# Altium integrated library 刘兴达Lib.IntLib: 614 symbols (part 1 of 4) (continued)
## BQ24640 (continued)
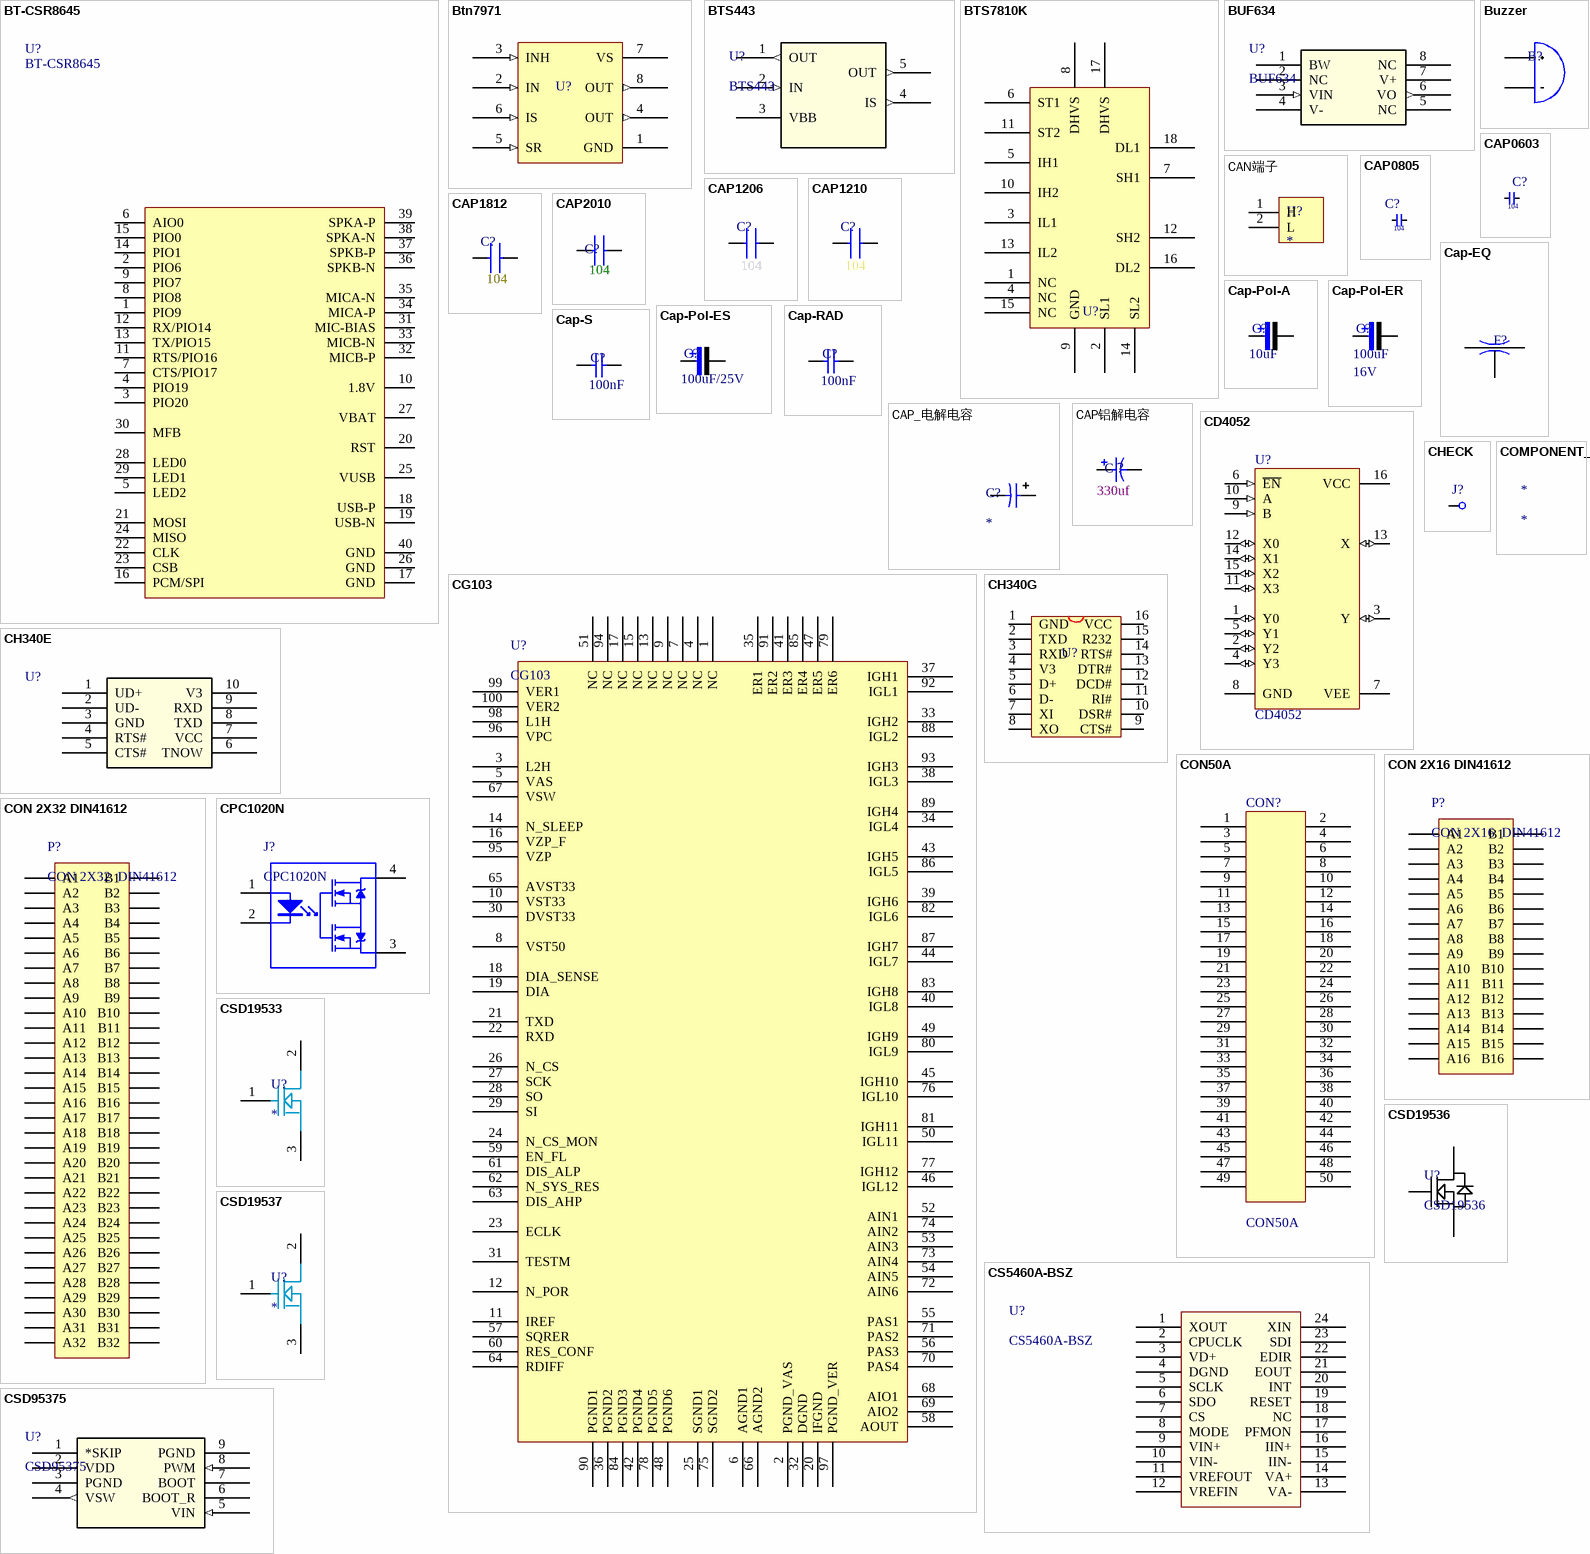
[diagram p3: symbols BT-CSR8645 to CSD95375]

## BT-CSR8645
designator U?
蓝牙模块
footprint HDR-BT86XX
pins: 1 PIO9, 2 PIO6, 3 PIO20, 4 PIO19, 5 LED2, 6 AIO0, 7 CTS/PIO17, 8 PIO8, 9 PIO7, 10 1.8V, 11 RTS/PIO16, 12 RX/PIO14, 13 TX/PIO15, 14 PIO1, 15 PIO0, 16 PCM/SPI, 17 GND, 18 USB-P, 19 USB-N, 20 RST, 21 MOSI, 22 CLK, 23 CSB, 24 MISO, 25 VUSB, 26 GND, 27 VBAT, 28 LED0, 29 LED1, 30 MFB, 31 MIC-BIAS, 32 MICB-P, 33 MICB-N, 34 MICA-P, 35 MICA-N, 36 SPKB-N, 37 SPKB-P, 38 SPKA-N, 39 SPKA-P, 40 GND

## Btn7971
designator U?  (value not drawn)
半桥驱动
footprint Btn7971
pins: 1 GND (power), 2 IN (in), 3 INH (in), 4 OUT (out), 5 SR (in), 6 IS (in), 7 VS (power), 8 OUT (out)

## BTS443
designator U?
MOS高端开关; Manufacturer_Part_Number: BTS443P; Vendor: Infineon; Built_By: EMA_UL_Team; Copyright: Copyright (C) 2018 Accelerated Designs. All rights reserved; RefDes: RefDes; Type: DEV; Value: Value
footprint TO-252-5
pins: 1 OUT (out), 2 IN (in), 3 VBB (power), 4 IS (out), 5 OUT (out)

## BTS7810K
designator U?  (value not drawn)
全桥驱动
footprint BTS7810K
pins: 1 NC, 2 SL1, 3 IL1, 4 NC, 5 IH1, 6 ST1, 7 SH1, 8 DHVS, 9 GND, 10 IH2, 11 ST2, 12 SH2, 13 IL2, 14 SL2, 15 NC, 16 DL2, 17 DHVS, 18 DL1

## BUF634
designator U?
高输出跟随器; Manufacturer: Texas Instruments; Manufacturer_Part_Number: buf634_d_8; INDUSTRY_STD_PKG_TYPE: SOIC; FAMILY_NAME: FIXED GAIN; PIN_COUNT: 8; PACKAGE_DESIGNATOR: D; Datasheet_URL: http://www.ti.com/lit/gpn/BUF634; GENERIC_PART_NUMBER: BUF634; Vendor: Texas Instruments; Value: Value; Type: Type; RefDes: RefDes
footprint SOIC-8 (3mm)
pins: 1 BW, 2 NC, 3 VIN (in), 4 V- (power), 5 NC, 6 VO (out), 7 V+ (power), 8 NC

## Buzzer
designator B?  (value not drawn)
蜂鸣器
footprint Bell_7.62
footprint Buzzer-8530
pins: 1 A, 2 B

## CAN端子
designator H?
footprint CAN端子
pins: 1 H, 2 L

## CAP0603
designator C?  (value not drawn)
footprint CAP0603
pins: 1, 2
text: 104

## CAP0805
designator C?, comment 104
footprint CAP
pins: 1, 2

## CAP1206
designator C?  (value not drawn)
footprint CAP1206
pins: 1, 2
text: 104

## CAP1210
designator C?  (value not drawn)
footprint CAP1210
pins: 1, 2
text: 104

## CAP1812
designator C?  (value not drawn)
footprint CAP1812
pins: 1, 2
text: 104

## CAP2010
designator C?  (value not drawn)
footprint CAP2010
pins: 1, 2
text: 104

## Cap-EQ
designator F?  (value not drawn)
馈通式电容; Published: 8-Jun-2000; LatestRevisionDate: 17-Jul-2002; LatestRevisionNote: Re-released for DXP Platform.; PackageReference: RAD-0.3; Publisher: Altium Limited
footprint 0805-EQ (0805带丝印)
pins: 1 IN, 2 GND, 3 OUT

## Cap-Pol-A
designator C?, comment value 10uF  (hidden comment: Cap-Pol)
钽电容; Published: 8-Jun-2000; LatestRevisionDate: 17-Jul-2002; LatestRevisionNote: Re-released for DXP Platform.; PackageReference: RB7.6-15; Publisher: Altium Limited
footprint CAP-7343 (钽电容)
footprint CAP-3528 (钽电容)
footprint CAP-3216 (钽电容)
footprint CAP-6032 (钽电容)
pins: 1, 2
1 alternate drawing of the same symbol

## Cap-Pol-ER
designator C?  value 100uF  Vol: 16V  (hidden comment: Cap-Pol-ER)
插件电解电容; Published: 8-Jun-2000; LatestRevisionDate: 17-Jul-2002; LatestRevisionNote: Re-released for DXP Platform.; PackageReference: RB7.6-15; Publisher: Altium Limited
footprint C-RB-5.0/10 (插件电解电容)
footprint C-RB-7.5/18 (插件电解电容)
footprint C-RB-3.5/8 (插件电解电容)
footprint C-RB-5.0/13 (插件电解电容)
pins: 1, 2
1 alternate drawing of the same symbol

## Cap-Pol-ES
designator C?  value 100uF/25V  (hidden comment: Cap-Pol-ES)
贴片铝电解电容; Published: 8-Jun-2000; LatestRevisionDate: 17-Jul-2002; LatestRevisionNote: Re-released for DXP Platform.; PackageReference: RB7.6-15; Publisher: Altium Limited
footprint C-RB-SD6 (贴片铝电解)
footprint C-RB-SD8 (贴片铝电解)
footprint C-RB-SD10 (贴片铝电解)
pins: 1, 2
1 alternate drawing of the same symbol

## Cap-RAD
designator C?, comment value 100nF  (hidden comment: Cap)
插件瓷片电容; Published: 8-Jun-2000; LatestRevisionDate: 17-Jul-2002; LatestRevisionNote: Re-released for DXP Platform.; PackageReference: RAD-0.3; Publisher: Altium Limited
footprint C-RAD (瓷片电容)
pins: 1, 2

## Cap-S
designator C?  value 100nF  (hidden comment: Cap-S)
贴片瓷片电容; Published: 8-Jun-2000; LatestRevisionDate: 17-Jul-2002; LatestRevisionNote: Re-released for DXP Platform.; PackageReference: RAD-0.3; Publisher: Altium Limited
footprint C-0805 (贴片电容)
footprint C-0603 (贴片电容)
footprint 0603-2 (贴片无丝印)
footprint 0805-2 (贴片无丝印)
footprint C-1210 (贴片电容)
footprint 1812 (贴片元件)
footprint 0402 (Chip Capacitor, Body 1.0x0.5mm, IPC High Density)
pins: 1, 2

## CAP_电解电容
designator C?
footprint C_CAP_10*8.3
pins: 1, 2

## CAP铝解电容
designator C？  (value not drawn)
footprint CAP铝解电容
pins: 1, 2
text: 330uf

## CD4052
designator U?
双通道模拟开关; Published: 17-Jul-2002; LatestRevisionDate: 13-Apr-2006; LatestRevisionNote: IPC-7351 Footprint Added.; DatasheetVersion: Jan-1999; PackageVersion: 2000; PackageReference: M16A; Publisher: Altium Limited; PackageDescription: 16-Pin Small Outline Integrated Circuit 1.27 mm Pitch; Code_IPC: SOIC127P600-16; ComponentLink1Description: Manufacturer Link; ComponentLink1URL: http://www.fairchildsemi.com/; ComponentLink2Description: Datasheet; ComponentLink2URL: http://www.fairchildsemi.com/ds/CD%2FCD4052BC.pdf
footprint SOIC-16
pins: 1 Y0 (io), 2 Y2 (io), 3 Y (io), 4 Y3 (io), 5 Y1 (io), 6 ~{EN} (in), 7 VEE (power), 8 GND (power), 9 B (in), 10 A (in), 11 X3 (io), 12 X0 (io), 13 X (io), 14 X1 (io), 15 X2 (io), 16 VCC (power)

## CG103
designator U?
BOSCH点火芯片
footprint LQFP-100 (LQFP)
pins: 1 NC, 2 PGND_VAS, 3 L2H, 4 NC, 5 VAS, 6 AGND1, 7 NC, 8 VST50, 9 NC, 10 VST33, 11 IREF, 12 N_POR, 13 NC, 14 N_SLEEP, 15 NC, 16 VZP_F, 17 NC, 18 DIA_SENSE, 19 DIA, 20 IFGND, 21 TXD, 22 RXD, 23 ECLK, 24 N_CS_MON, 25 SGND1, 26 N_CS, 27 SCK, 28 SO, 29 SI, 30 DVST33, 31 TESTM, 32 DGND, 33 IGH2, 34 IGL4, 35 ER1, 36 PGND2, 37 IGH1, 38 IGL3, 39 IGH6, 40 IGL8, 41 ER3, 42 PGND4, 43 IGH5, 44 IGL7, 45 IGH10, 46 IGL12, 47 ER5, 48 PGND6, 49 IGH9, 50 IGL11, 51 NC, 52 AIN1, 53 AIN3, 54 AIN5, 55 PAS1, 56 PAS3, 57 SQRER, 58 AOUT, 59 EN_FL, 60 RES_CONF, 61 DIS_ALP, 62 N_SYS_RES, 63 DIS_AHP, 64 RDIFF, 65 AVST33, 66 AGND2, 67 VSW, 68 AIO1, 69 AIO2, 70 PAS4, 71 PAS2, 72 AIN6, 73 AIN4, 74 AIN2, 75 SGND2, 76 IGL10, 77 IGH12, 78 PGND5, 79 ER6, 80 IGL9, 81 IGH11, 82 IGL6, 83 IGH8, 84 PGND3, 85 ER4, 86 IGL5, 87 IGH7, 88 IGL2, 89 IGH4, 90 PGND1, 91 ER2, 92 IGL1, 93 IGH3, 94 NC, 95 VZP, 96 VPC, 97 PGND_VER, 98 L1H, 99 VER1, 100 VER2

## CH340E
designator U?
USB转串口; Manufacturer: Texas Instruments; Manufacturer_Part_Number: SN74LVC1G14DBVR; Built_By: EMA_UL_Team; Vendor: Texas Instruments; Copyright: Copyright (C) 2018 Accelerated Designs. All rights reserved; RefDes: RefDes; Type: DEV; Value: Value
footprint MSOP-10
pins: 1 UD+, 2 UD-, 3 GND (power), 4 RTS#, 5 CTS# (power), 6 TNOW, 7 VCC, 8 TXD, 9 RXD, 10 V3

## CH340G
designator U?  (value not drawn)
usb转串口
footprint SOIC-16
pins: 1 GND, 2 TXD, 3 RXD, 4 V3, 5 D+, 6 D-, 7 XI, 8 XO, 9 CTS#, 10 DSR#, 11 RI#, 12 DCD#, 13 DTR#, 14 RTS#, 15 R232, 16 VCC

## CHECK
designator J?  (value not drawn)
测试点
footprint CHECK-A (Connector; Plug)
footprint CHECK-B (Connector; Plug)
pins: 1

## COMPONENT_1
designator *

## CON50A
designator CON?
Remark: 0.5mm 50P B2B 3.5mm合高 母头
footprint B2B_0D50_50P_MALE
pins: 1, 2, 3, 4, 5, 6, 7, 8, 9, 10, 11, 12, 13, 14, 15, 16, 17, 18, 19, 20, 21, 22, 23, 24, 25, 26, 27, 28, 29, 30, 31, 32, 33, 34, 35, 36, 37, 38, 39, 40, 41, 42, 43, 44, 45, 46, 47, 48, 49, 50
2 alternate drawings of the same symbol

## CON 2X16 DIN41612
designator P?, comment CON 2X16  DIN41612
DIN 41612
footprint EURO2.54-2H32D (Connector; DIN 41612, Type 2B, Thru-Hole; Rows a+b, 32 Position; Right Angle)
footprint EURO2.54-2V32B (Connector; DIN 41612, Type 2B, Thru-Hole; Rows a+b, 32 Position; Vertical)
pins: A1, A2, A3, A4, A5, A6, A7, A8, A9, A10, A11, A12, A13, A14, A15, A16, B1, B2, B3, B4, B5, B6, B7, B8, B9, B10, B11, B12, B13, B14, B15, B16

## CON 2X32 DIN41612
designator P?, comment CON 2X32  DIN41612
DIN 41612
footprint EURO2.54-2H64A (Connector; DIN 41612, Type B, Thru-Hole; Rows a+b, 64 Position; Right Angle)
footprint EURO2.54-2V64A (Connector; DIN 41612, Type B, Thru-Hole; Rows a+b, 64 Position; Vertical)
pins: A1, A2, A3, A4, A5, A6, A7, A8, A9, A10, A11, A12, A13, A14, A15, A16, A17, A18, A19, A20, A21, A22, A23, A24, A25, A26, A27, A28, A29, A30, A31, A32, B1, B2, B3, B4, B5, B6, B7, B8, B9, B10, B11, B12, B13, B14, B15, B16, B17, B18, B19, B20, B21, B22, B23, B24, B25, B26, B27, B28, B29, B30, B31, B32

## CPC1020N
designator J?
固态继电器
footprint SOP-4 (SOP, 4-Leads, Body 2.7x4.5mm (max), Pitch 1.27mm, IPC Medium Density)
pins: 1 A "Anode", 2 K "Cathode", 3, 4

## CS5460A-BSZ
designator U?
电能计量; Vendor: Cirrus Logic; Built_By: EMA_UL_Team; Manufacturer_Part_Number: CS5460A-BSZ; Copyright: Copyright (C) 2018 Accelerated Designs. All rights reserved; RefDes: RefDes; Type: DEV; Value: Value
footprint SSOP-24
pins: 1 XOUT, 2 CPUCLK, 3 VD+ (power), 4 DGND (power), 5 SCLK, 6 SDO, 7 CS, 8 MODE, 9 VIN+, 10 VIN-, 11 VREFOUT, 12 VREFIN, 13 VA- (power), 14 VA+ (power), 15 IIN-, 16 IIN+, 17 PFMON (power), 18 NC, 19 RESET, 20 INT, 21 EOUT, 22 EDIR, 23 SDI, 24 XIN

## CSD19533
designator U?
MOS; Manufacturer_Part_Number: CSD19537Q3; VdsMax: 100.0; IdsMax: 50.0; Rdson45: 0.025; QgTyp: 16.0; Vendor: Texas Instruments; Datasheet_URL: http://www.ti.com/lit/ds/symlink/csd19537q3.pdf; Quantity: 1; RefDes: RefDes; Type: TYPE; Value: Value
footprint VSONP-8
pins: 1 Gate, 2 Drain, 3 Source

## CSD19536
designator U?
MOS; Manufacturer_Part_Number: CSD19536KTT; Vendor: Texas Instruments; Built_By: Texas_Instrument_Team; Copyright: Copyright (C) 2018 Accelerated Designs. All rights reserved; RefDes: RefDes; Type: DEV; Value: Value
footprint TO-263-3
pins: 1 Gate, 2 Drain, 3 Source

## CSD19537
designator U?
MOS; Manufacturer_Part_Number: CSD19537Q3; VdsMax: 100.0; IdsMax: 50.0; Rdson45: 0.025; QgTyp: 16.0; Vendor: Texas Instruments; Datasheet_URL: http://www.ti.com/lit/ds/symlink/csd19537q3.pdf; Quantity: 1; RefDes: RefDes; Type: TYPE; Value: Value
footprint SON 3.3*3.3
pins: 1 Gate, 2 Drain, 3 Source

## CSD95375
designator U?
24V功率级; Manufacturer_Part_Number: CSD95375Q4M; Vendor: Texas Instruments; Built_By: EMA_UL_Team; Copyright: Copyright (C) 2018 Accelerated Designs. All rights reserved; RefDes: RefDes; Type: DEV; Value: Value
footprint VSON-8
pins: 1 *SKIP, 2 VDD (power), 3 PGND (power), 4 VSW (out), 5 VIN (in), 6 BOOT_R, 7 BOOT, 8 PWM (in), 9 PGND (power)

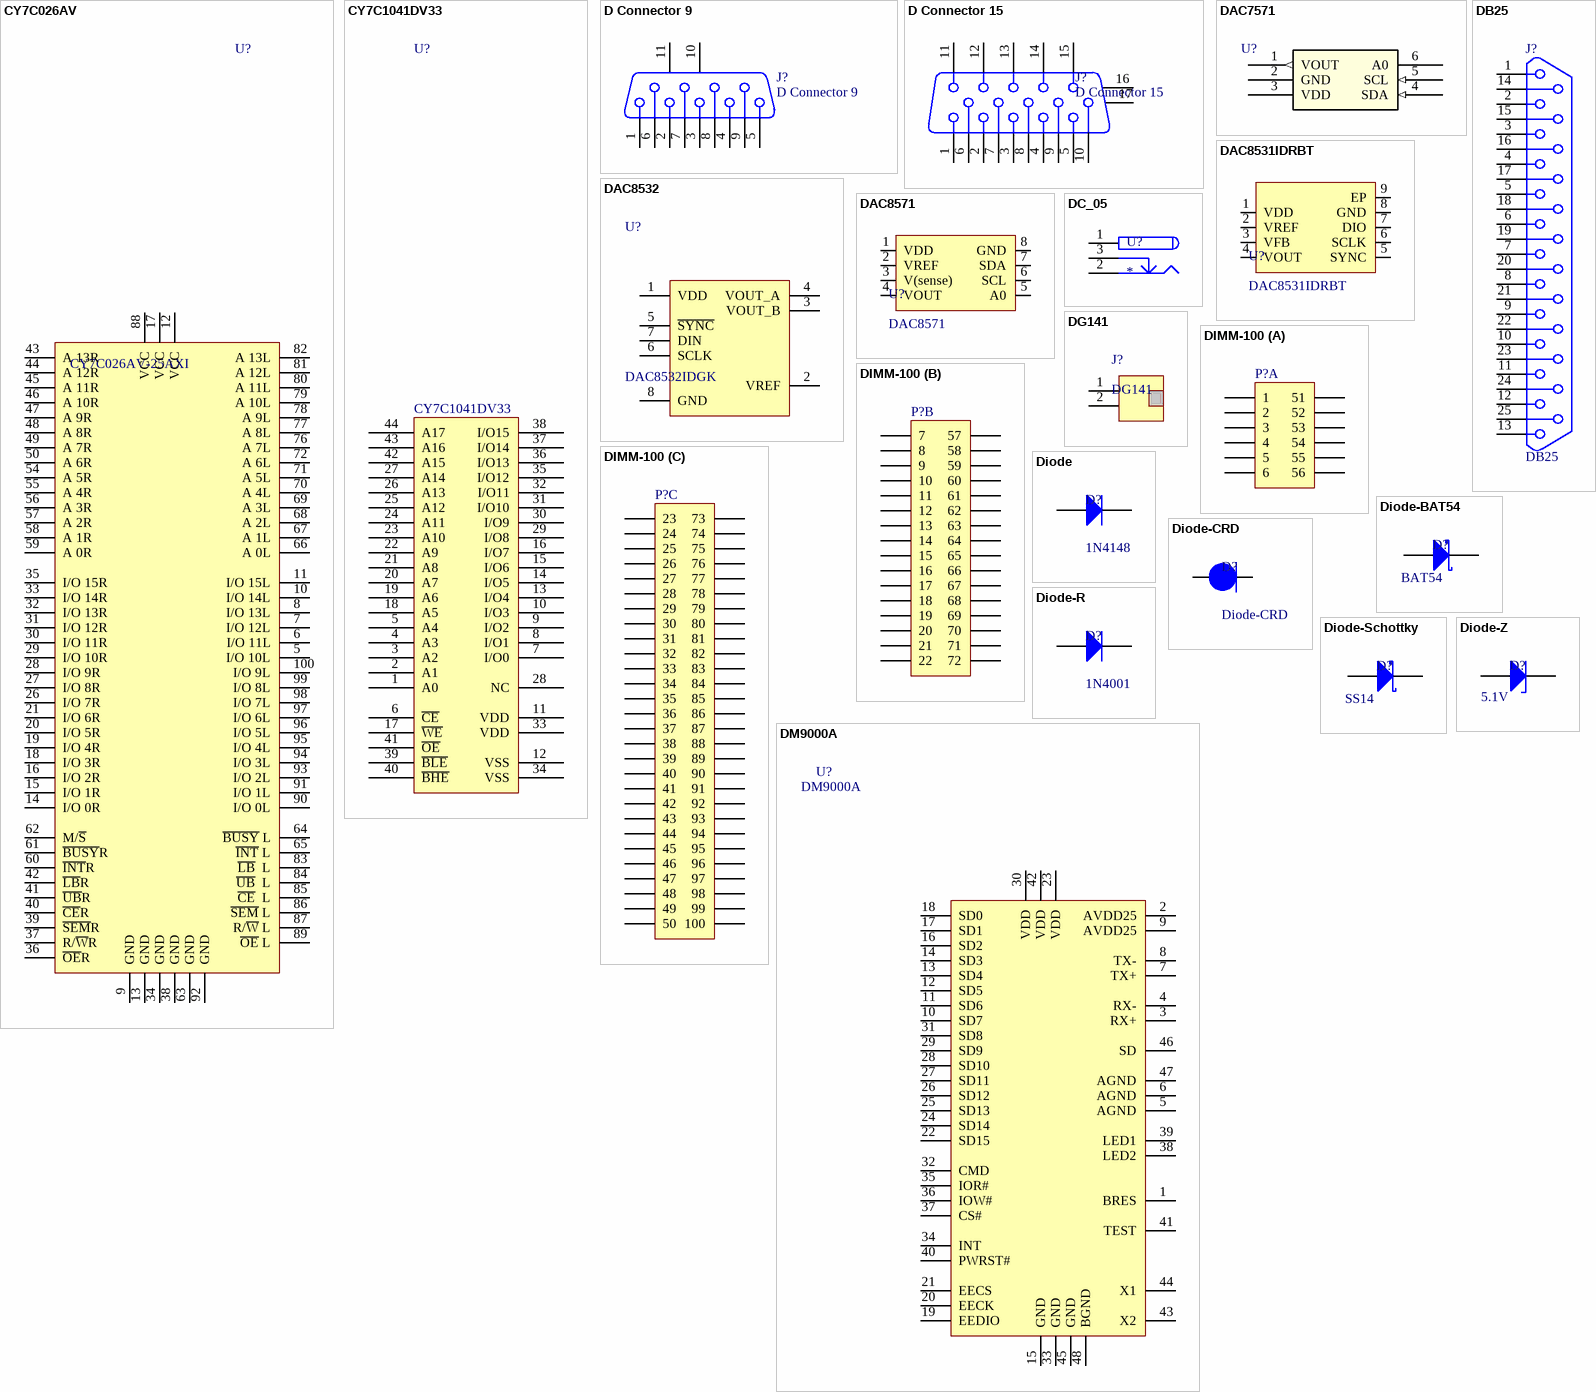
[diagram p4: symbols CY7C026AV to DM9000A]

## CY7C026AV
designator U?, comment CY7C026AV-25AXI
RAM
footprint TQFP-100 (Thin QFP, 100-Leads, Body 14x14mm, Pitch 0.5mm, IPC Low Density)
pins: 1 NC hidden, 2 NC hidden, 3 NC hidden, 4 NC hidden, 5 I/O 10L, 6 I/O 11L, 7 I/O 12L, 8 I/O 13L, 9 GND, 10 I/O 14L, 11 I/O 15L, 12 VCC, 13 GND, 14 I/O 0R, 15 I/O 1R, 16 I/O 2R, 17 VCC, 18 I/O 3R, 19 I/O 4R, 20 I/O 5R, 21 I/O 6R, 22 NC hidden, 23 NC hidden, 24 NC hidden, 25 NC hidden, 26 I/O 7R, 27 I/O 8R, 28 I/O 9R, 29 I/O 10R, 30 I/O 11R, 31 I/O 12R, 32 I/O 13R, 33 I/O 14R, 34 GND, 35 I/O 15R, 36 ~{OE}R, 37 R/~{W}R, 38 GND, 39 ~{SEM}R, 40 ~{CE}R, 41 ~{UB}R, 42 ~{LB}R, 43 A 13R, 44 A 12R, 45 A 11R, 46 A 10R, 47 A 9R, 48 A 8R, 49 A 7R, 50 A 6R, 51 NC hidden, 52 NC hidden, 53 NC hidden, 54 A 5R, 55 A 4R, 56 A 3R, 57 A 2R, 58 A 1R, 59 A 0R, 60 ~{INT}R, 61 ~{BUSY}R, 62 M/~{S}, 63 GND, 64 ~{BUSY} L, 65 ~{INT} L, 66 A 0L, 67 A 1L, 68 A 2L, 69 A 3L, 70 A 4L, 71 A 5L, 72 A 6L, 73 NC hidden, 74 NC hidden, 75 NC hidden, 76 A 7L, 77 A 8L, 78 A 9L, 79 A 10L, 80 A 11L, 81 A 12L, 82 A 13L, 83 ~{LB}  L, 84 ~{UB}  L, 85 ~{CE}  L, 86 ~{SEM} L, 87 R/~{W} L, 88 VCC, 89 ~{OE} L, 90 I/O 0L, 91 I/O 1L, 92 GND, 93 I/O 2L, 94 I/O 3L, 95 I/O 4L, 96 I/O 5L, 97 I/O 6L, 98 I/O 7L, 99 I/O 8L, 100 I/O 9L

## CY7C1041DV33
designator U?
RAM
footprint TSOP-44 (TSOP)
pins: 1 A0, 2 A1, 3 A2, 4 A3, 5 A4, 6 ~{CE}, 7 I/O0, 8 I/O1, 9 I/O2, 10 I/O3, 11 VDD, 12 VSS, 13 I/O4, 14 I/O5, 15 I/O6, 16 I/O7, 17 ~{WE}, 18 A5, 19 A6, 20 A7, 21 A8, 22 A9, 23 A10, 24 A11, 25 A12, 26 A13, 27 A14, 28 NC, 29 I/O8, 30 I/O9, 31 I/O10, 32 I/O11, 33 VDD, 34 VSS, 35 I/O12, 36 I/O13, 37 I/O14, 38 I/O15, 39 ~{BLE}, 40 ~{BHE}, 41 ~{OE}, 42 A15, 43 A16, 44 A17

## D Connector 9
designator J?
串口; PackageDocument: O; Positions: 9; Gender: Receptacle; Published: 15-Jun-2001; LatestRevisionDate: 17-Jul-2002; LatestRevisionNote: Re-released for DXP Platform.; DatasheetDocument: 1-Sep-1999; PackageReference: 788750; Publisher: Altium Limited; Orientation: Right Angle
footprint DB9-M (DB9公座)
footprint DB9-F (DB9母座)
pins: 1, 2, 3, 4, 5, 6, 7, 8, 9, 10 MH1, 11 MH2

## D Connector 15
designator J?
VGA; PackageDocument: O; Positions: 9; Gender: Receptacle; Published: 15-Jun-2001; LatestRevisionDate: 17-Jul-2002; LatestRevisionNote: Re-released for DXP Platform.; DatasheetDocument: 1-Sep-1999; PackageReference: 788750; Publisher: Altium Limited; Orientation: Right Angle
footprint DB15-M (VGA公)
footprint DB15-F (VGA母)
pins: 1, 2, 3, 4, 5, 6, 7, 8, 9, 10, 11, 12, 13, 14, 15, 16 MH2, 17 MH1

## DAC7571
designator U?
12位轨到轨DAC; Manufacturer: Texas Instruments; Manufacturer_Part_Number: DAC7571IDBVR; Built_By: EMA_UL_Team; Vendor: Texas Instruments; Copyright: Copyright (C) 2018 Accelerated Designs. All rights reserved; RefDes: RefDes; Type: DEV; Value: Value
footprint SOT-23-6
pins: 1 VOUT (out), 2 GND (power), 3 VDD (power), 4 SDA (in), 5 SCL (in), 6 A0

## DAC8531IDRBT
designator U?
小封装DAC
footprint SON-8
pins: 1 VDD, 2 VREF, 3 VFB, 4 VOUT, 5 SYNC, 6 SCLK, 7 DIO, 8 GND, 9 EP

## DAC8532
designator U?, comment DAC8532IDGK
数模转换; Type: DAC8532IDGK
footprint MSOP-8 (TSOP)
pins: 1 VDD (power), 2 VREF, 3 VOUT_B, 4 VOUT_A, 5 ~{SYNC}, 6 SCLK, 7 DIN, 8 GND

## DAC8571
designator U?
footprint VSSOP-8
pins: 1 VDD, 2 VREF, 3 V(sense), 4 VOUT, 5 A0, 6 SCL, 7 SDA, 8 GND

## DB25
designator J?
并口
footprint DB25
pins: 1, 2, 3, 4, 5, 6, 7, 8, 9, 10, 11, 12, 13, 14, 15, 16, 17, 18, 19, 20, 21, 22, 23, 24, 25

## DC_05
designator U?
直流端口
footprint DC-005
pins: 1 (power), 2 (power), 3 (power)

## DG141
designator J?
footprint DG141R-2.54 (接线端子)
pins: 1, 2

## DIMM-100
designator P?  (value not drawn)
接插件; LatestRevisionDate: 17-Jul-2002; LatestRevisionNote: Re-released for DXP Platform.; Publisher: Altium Limited
footprint DIMM1.27-100
part A pins: 1, 2, 3, 4, 5, 6, 51, 52, 53, 54, 55, 56
part B pins: 7, 8, 9, 10, 11, 12, 13, 14, 15, 16, 17, 18, 19, 20, 21, 22, 57, 58, 59, 60, 61, 62, 63, 64, 65, 66, 67, 68, 69, 70, 71, 72
part C pins: 23, 24, 25, 26, 27, 28, 29, 30, 31, 32, 33, 34, 35, 36, 37, 38, 39, 40, 41, 42, 43, 44, 45, 46, 47, 48, 49, 50, 73, 74, 75, 76, 77, 78, 79, 80, 81, 82, 83, 84, 85, 86, 87, 88, 89, 90, 91, 92, 93, 94, 95, 96, 97, 98, 99, 100

## Diode
designator D?, comment 1N4148
二极管; Published: 8-Jun-2000; LatestRevisionDate: 17-Jul-2002; LatestRevisionNote: Re-released for DXP Platform.; PackageDocument: Sep-1996; PackageReference: SMC; Publisher: Altium Limited; Code_JEDEC: DO-214-AB
footprint D-AXL (插件二极管)
footprint D-1206 (贴片二极管)
footprint D-SMA (贴片二极管)
pins: 1 A, 2 K

## Diode-BAT54
designator D?  Type: BAT54  (hidden comment: Diode-BAT54)
肖特基二极管; Published: 8-Jun-2000; LatestRevisionDate: 17-Jul-2002; LatestRevisionNote: Re-released for DXP Platform.; PackageReference: SMB; Publisher: Altium Limited; Code_JEDEC: DO-214-AA
footprint SOT23-3
pins: 1 A, 3 K

## Diode-CRD
designator D?
恒流二极管; Published: 8-Jun-2000; LatestRevisionDate: 17-Jul-2002; LatestRevisionNote: Re-released for DXP Platform.; PackageDocument: Sep-1996; PackageReference: SMC; Publisher: Altium Limited; Code_JEDEC: DO-214-AB
footprint D-AXL (插件二极管)
footprint D-1206 (贴片二极管)
footprint D-SMA (贴片二极管)
pins: 1 A, 2 K

## Diode-R
designator D?, comment 1N4001
整流二极管; Published: 8-Jun-2000; LatestRevisionDate: 17-Jul-2002; LatestRevisionNote: Re-released for DXP Platform.; PackageDocument: Sep-1996; PackageReference: SMC; Publisher: Altium Limited
footprint D-AXL (插件二极管)
footprint D-1206 (贴片二极管)
footprint D-SMA (贴片二极管)
footprint MELF (贴片二极管)
pins: 1 A, 2 K

## Diode-Schottky
designator D?  Type: SS14  (hidden comment: Diode-Schottky)
肖特基二极管; Published: 8-Jun-2000; LatestRevisionDate: 17-Jul-2002; LatestRevisionNote: Re-released for DXP Platform.; PackageReference: SMB; Publisher: Altium Limited; Code_JEDEC: DO-214-AA
footprint D-SMA (贴片二极管)
footprint D-SMC (贴片二极管)
footprint D-SMB (DO-214-AA/SMB; 2 C-Bend Leads; Body 5.3 x 3.6 mm, inc. leads (LxW))
pins: 1 A, 2 K

## Diode-Z
designator D?  value 5.1V  (hidden comment: Diode-Z)
稳压二极管; Published: 8-Jun-2000; LatestRevisionDate: 17-Jul-2002; LatestRevisionNote: Re-released for DXP Platform.; PackageReference: SMB; Publisher: Altium Limited; Code_JEDEC: DO-214-AA
footprint D-AXL (插件二极管)
footprint D-1206 (贴片二极管)
pins: 1 A, 2 K

## DM9000A
designator U?
网络芯片
footprint LQFP-48 (LQFP)
pins: 1 BRES, 2 AVDD25, 3 RX+, 4 RX-, 5 AGND, 6 AGND, 7 TX+, 8 TX-, 9 AVDD25, 10 SD7, 11 SD6, 12 SD5, 13 SD4, 14 SD3, 15 GND, 16 SD2, 17 SD1, 18 SD0, 19 EEDIO, 20 EECK, 21 EECS, 22 SD15, 23 VDD, 24 SD14, 25 SD13, 26 SD12, 27 SD11, 28 SD10, 29 SD9, 30 VDD, 31 SD8, 32 CMD, 33 GND, 34 INT, 35 IOR#, 36 IOW#, 37 CS#, 38 LED2, 39 LED1, 40 PWRST#, 41 TEST, 42 VDD, 43 X2, 44 X1, 45 GND, 46 SD, 47 AGND, 48 BGND

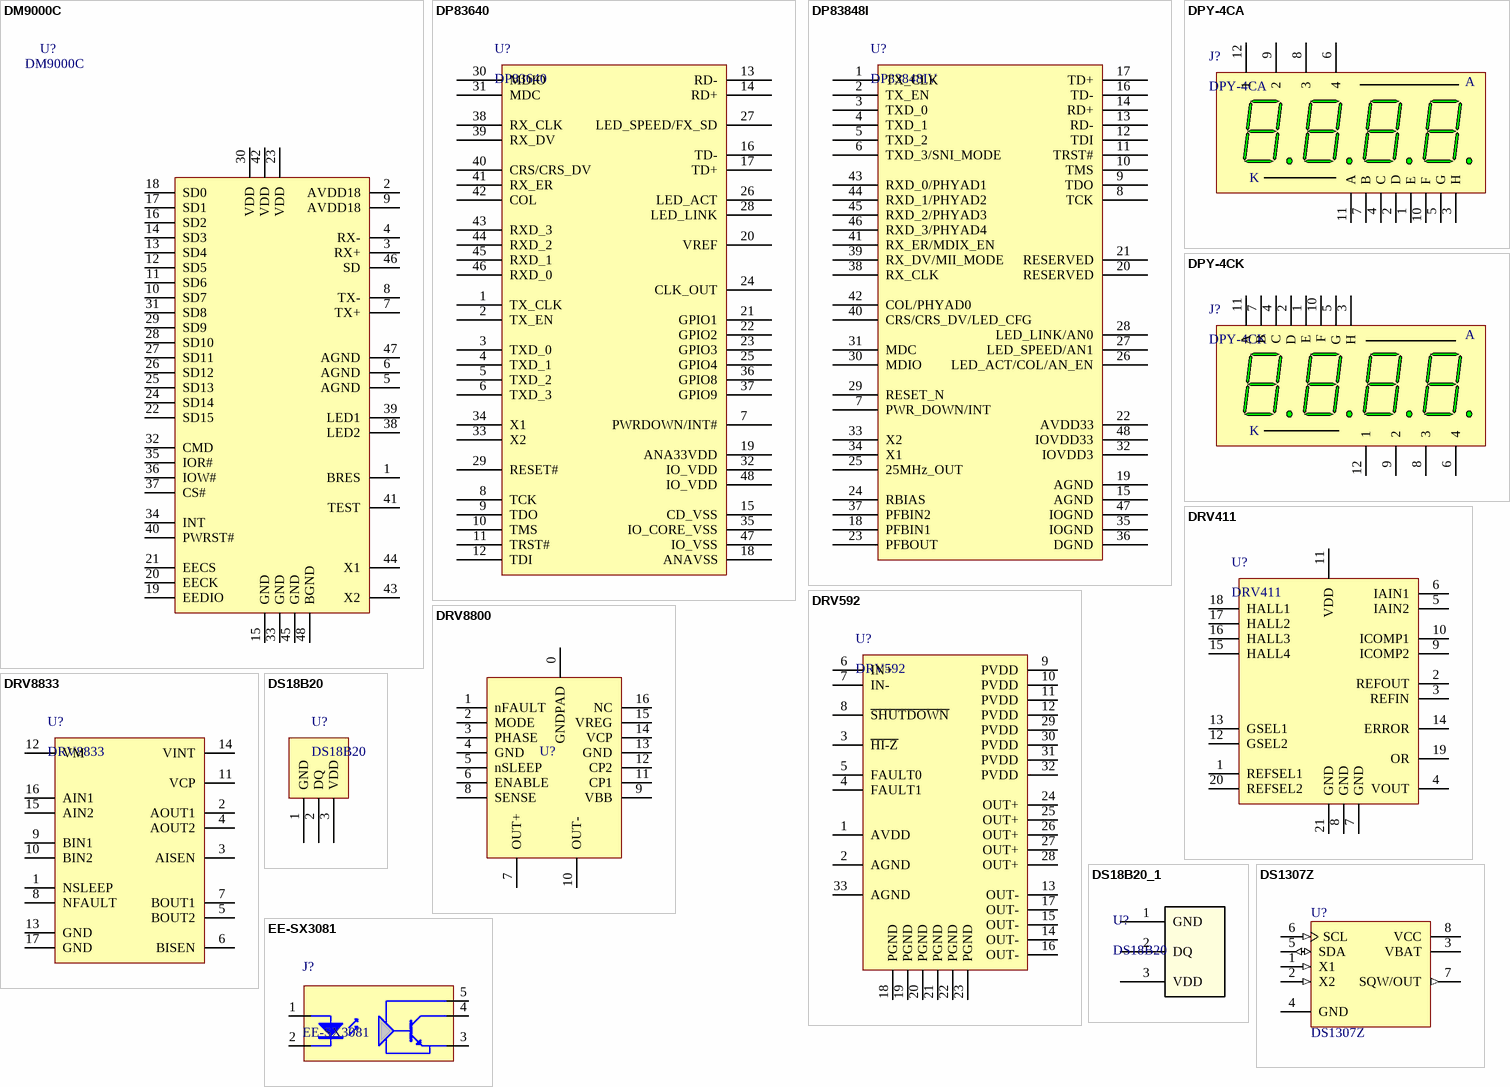
[diagram p5: symbols DM9000C to EE-SX3081]

## DM9000C
designator U?
网络芯片
footprint LQFP-48 (LQFP)
pins: 1 BRES, 2 AVDD18, 3 RX+, 4 RX-, 5 AGND, 6 AGND, 7 TX+, 8 TX-, 9 AVDD18, 10 SD7, 11 SD6, 12 SD5, 13 SD4, 14 SD3, 15 GND, 16 SD2, 17 SD1, 18 SD0, 19 EEDIO, 20 EECK, 21 EECS, 22 SD15, 23 VDD, 24 SD14, 25 SD13, 26 SD12, 27 SD11, 28 SD10, 29 SD9, 30 VDD, 31 SD8, 32 CMD, 33 GND, 34 INT, 35 IOR#, 36 IOW#, 37 CS#, 38 LED2, 39 LED1, 40 PWRST#, 41 TEST, 42 VDD, 43 X2, 44 X1, 45 GND, 46 SD, 47 AGND, 48 BGND

## DP83640
designator U?
网络芯片
footprint LQFP-48 (LQFP)
pins: 1 TX_CLK, 2 TX_EN, 3 TXD_0, 4 TXD_1, 5 TXD_2, 6 TXD_3, 7 PWRDOWN/INT#, 8 TCK, 9 TDO, 10 TMS, 11 TRST#, 12 TDI, 13 RD-, 14 RD+, 15 CD_VSS, 16 TD-, 17 TD+, 18 ANAVSS, 19 ANA33VDD, 20 VREF, 21 GPIO1, 22 GPIO2, 23 GPIO3, 24 CLK_OUT, 25 GPIO4, 26 LED_ACT, 27 LED_SPEED/FX_SD, 28 LED_LINK, 29 RESET#, 30 MDIO, 31 MDC, 32 IO_VDD, 33 X2, 34 X1, 35 IO_CORE_VSS, 36 GPIO8, 37 GPIO9, 38 RX_CLK, 39 RX_DV, 40 CRS/CRS_DV, 41 RX_ER, 42 COL, 43 RXD_3, 44 RXD_2, 45 RXD_1, 46 RXD_0, 47 IO_VSS, 48 IO_VDD

## DP83848I
designator U?, comment DP83848IV
网络芯片
footprint LQFP-48 (LQFP)
pins: 1 TX_CLK, 2 TX_EN, 3 TXD_0, 4 TXD_1, 5 TXD_2, 6 TXD_3/SNI_MODE, 7 PWR_DOWN/INT, 8 TCK, 9 TDO, 10 TMS, 11 TRST#, 12 TDI, 13 RD-, 14 RD+, 15 AGND, 16 TD-, 17 TD+, 18 PFBIN1, 19 AGND, 20 RESERVED, 21 RESERVED, 22 AVDD33, 23 PFBOUT, 24 RBIAS, 25 25MHz_OUT, 26 LED_ACT/COL/AN_EN, 27 LED_SPEED/AN1, 28 LED_LINK/AN0, 29 RESET_N, 30 MDIO, 31 MDC, 32 IOVDD3, 33 X2, 34 X1, 35 IOGND, 36 DGND, 37 PFBIN2, 38 RX_CLK, 39 RX_DV/MII_MODE, 40 CRS/CRS_DV/LED_CFG, 41 RX_ER/MDIX_EN, 42 COL/PHYAD0, 43 RXD_0/PHYAD1, 44 RXD_1/PHYAD2, 45 RXD_2/PHYAD3, 46 RXD_3/PHYAD4, 47 IOGND, 48 IOVDD33

## DPY-4CA
designator J?
共阳4位数码管
footprint DYP-4BIT (数码管)
pins: 1 E "Anode", 2 D "Anode", 3 H "Anode", 4 C "Anode", 5 G "Anode", 6 4 "Cathode", 7 B "Anode", 8 3 "Anode", 9 2 "Anode", 10 F "Anode", 11 A "Anode", 12 1 "Cathode"
text: K

## DPY-4CK
designator J?
共阴4位数码管
footprint DYP-4BIT (数码管)
pins: 1 E "Anode", 2 D "Anode", 3 H "Anode", 4 C "Anode", 5 G "Anode", 6 4 "Cathode", 7 B "Anode", 8 3 "Anode", 9 2 "Anode", 10 F "Anode", 11 A "Anode", 12 1 "Cathode"
text: K

## DRV411
designator U?
闭环磁电流
footprint TSSOP-20P (TSOP, 20-Leads, Body 6.5x4.4mm, Pitch 0.65mm, IPC Low Density)
pins: 1 REFSEL1, 2 REFOUT, 3 REFIN, 4 VOUT, 5 IAIN2, 6 IAIN1, 7 GND, 8 GND, 9 ICOMP2, 10 ICOMP1, 11 VDD, 12 GSEL2, 13 GSEL1, 14 ERROR, 15 HALL4, 16 HALL3, 17 HALL2, 18 HALL1, 19 OR, 20 REFSEL2, 21 GND

## DRV592
designator U?
TEC控制器
footprint LQFP-32P (LQFP)
pins: 1 AVDD, 2 AGND, 3 ~{HI-Z}, 4 FAULT1, 5 FAULT0, 6 IN+, 7 IN-, 8 ~{SHUTDOWN}, 9 PVDD, 10 PVDD, 11 PVDD, 12 PVDD, 13 OUT-, 14 OUT-, 15 OUT-, 16 OUT-, 17 OUT-, 18 PGND, 19 PGND, 20 PGND, 21 PGND, 22 PGND, 23 PGND, 24 OUT+, 25 OUT+, 26 OUT+, 27 OUT+, 28 OUT+, 29 PVDD, 30 PVDD, 31 PVDD, 32 PVDD, 33 AGND

## DRV8800
designator U?  (value not drawn)
footprint DRV8800
pins: 0 GNDPAD, 1 nFAULT, 2 MODE, 3 PHASE, 4 GND, 5 nSLEEP, 6 ENABLE, 7 OUT+, 8 SENSE, 9 VBB, 10 OUT-, 11 CP1, 12 CP2, 13 GND, 14 VCP, 15 VREG, 16 NC

## DRV8833
designator U?
闭环磁电流
footprint TSSOP-16P (TSOP, 16-Leads, Body 5x4.4mm, Pitch 0.65mm, IPC Low Density)
pins: 1 NSLEEP, 2 AOUT1, 3 AISEN, 4 AOUT2, 5 BOUT2, 6 BISEN, 7 BOUT1, 8 NFAULT, 9 BIN1, 10 BIN2, 11 VCP, 12 VM, 13 GND, 14 VINT, 15 AIN2, 16 AIN1, 17 GND

## DS18B20
designator U?
温度传感器
footprint TO-92A (直插三极管)
pins: 1 GND, 2 DQ, 3 VDD

## DS18B20_1
designator U?, comment DS18B20
温度传感器; Manufacturer_Part_Number: DS18B20+PAR; Vendor: Maxim Integrated Products; Built_By: EMA_UL_Team; Copyright: Copyright (C) 2018 Accelerated Designs. All rights reserved; RefDes: RefDes; Type: DEV; Value: Value
footprint TO-92
pins: 1 GND (power), 2 DQ, 3 VDD (power)

## DS1307Z
designator U?
实时时钟; Published: 13-Oct-2000; LatestRevisionDate: 13-Apr-2006; LatestRevisionNote: IPC-7351 Footprint Added.; DatasheetVersion: 10-Aug-1999; PackageVersion: 1999; PackageReference: SOIC8N; Publisher: Altium Limited; PackageDescription: 8-Pin Small Outline Integrated Circuit 1.27 mm Pitch; Code_IPC: SOIC127P600-8; ComponentLink1Description: Manufacturer Link; ComponentLink1URL: http://www.maxim-ic.com/; ComponentLink2Description: Datasheet; ComponentLink2URL: http://pdfserv.maxim-ic.com/en/ds/DS1307.pdf; ComponentLink3Description: Discontinuation Notice; ComponentLink3URL: http://www.maxim-ic.com/qa/pdfs/non-obsolescence-letter.pdf
footprint SOIC-8
pins: 1 X1 (in), 2 X2 (in), 3 VBAT (power), 4 GND (power), 5 SDA (io), 6 SCL (in), 7 SQW/OUT (out), 8 VCC (power)

## EE-SX3081
designator J?
光耦; Published: 24-Mar-1999; LatestRevisionDate: 04-Mar-2005; LatestRevisionNote: Sch pins 3 & 4 Swapped.; DatasheetDocument: Nov-2003; PackageReference: DIP-4; Publisher: Altium Limited
footprint SX3081
pins: 1 A "Anode", 2 K "Cathode", 3 GND "Emitter", 4 OUT "Collector", 5 VCC
